# Altium footprint library FOC.PcbLib: 148 footprints (part 6 of 10)
Each footprint in its own frame and in the unit in brackets; x right, y up, seen from the top. Pads: shape width x height; smd on the part's side, far side on the other; paste and mask are expansions set on the pad; w line width, h text height; cw(c..) or ccw(c..) is an arc to the next point about the centre after c.
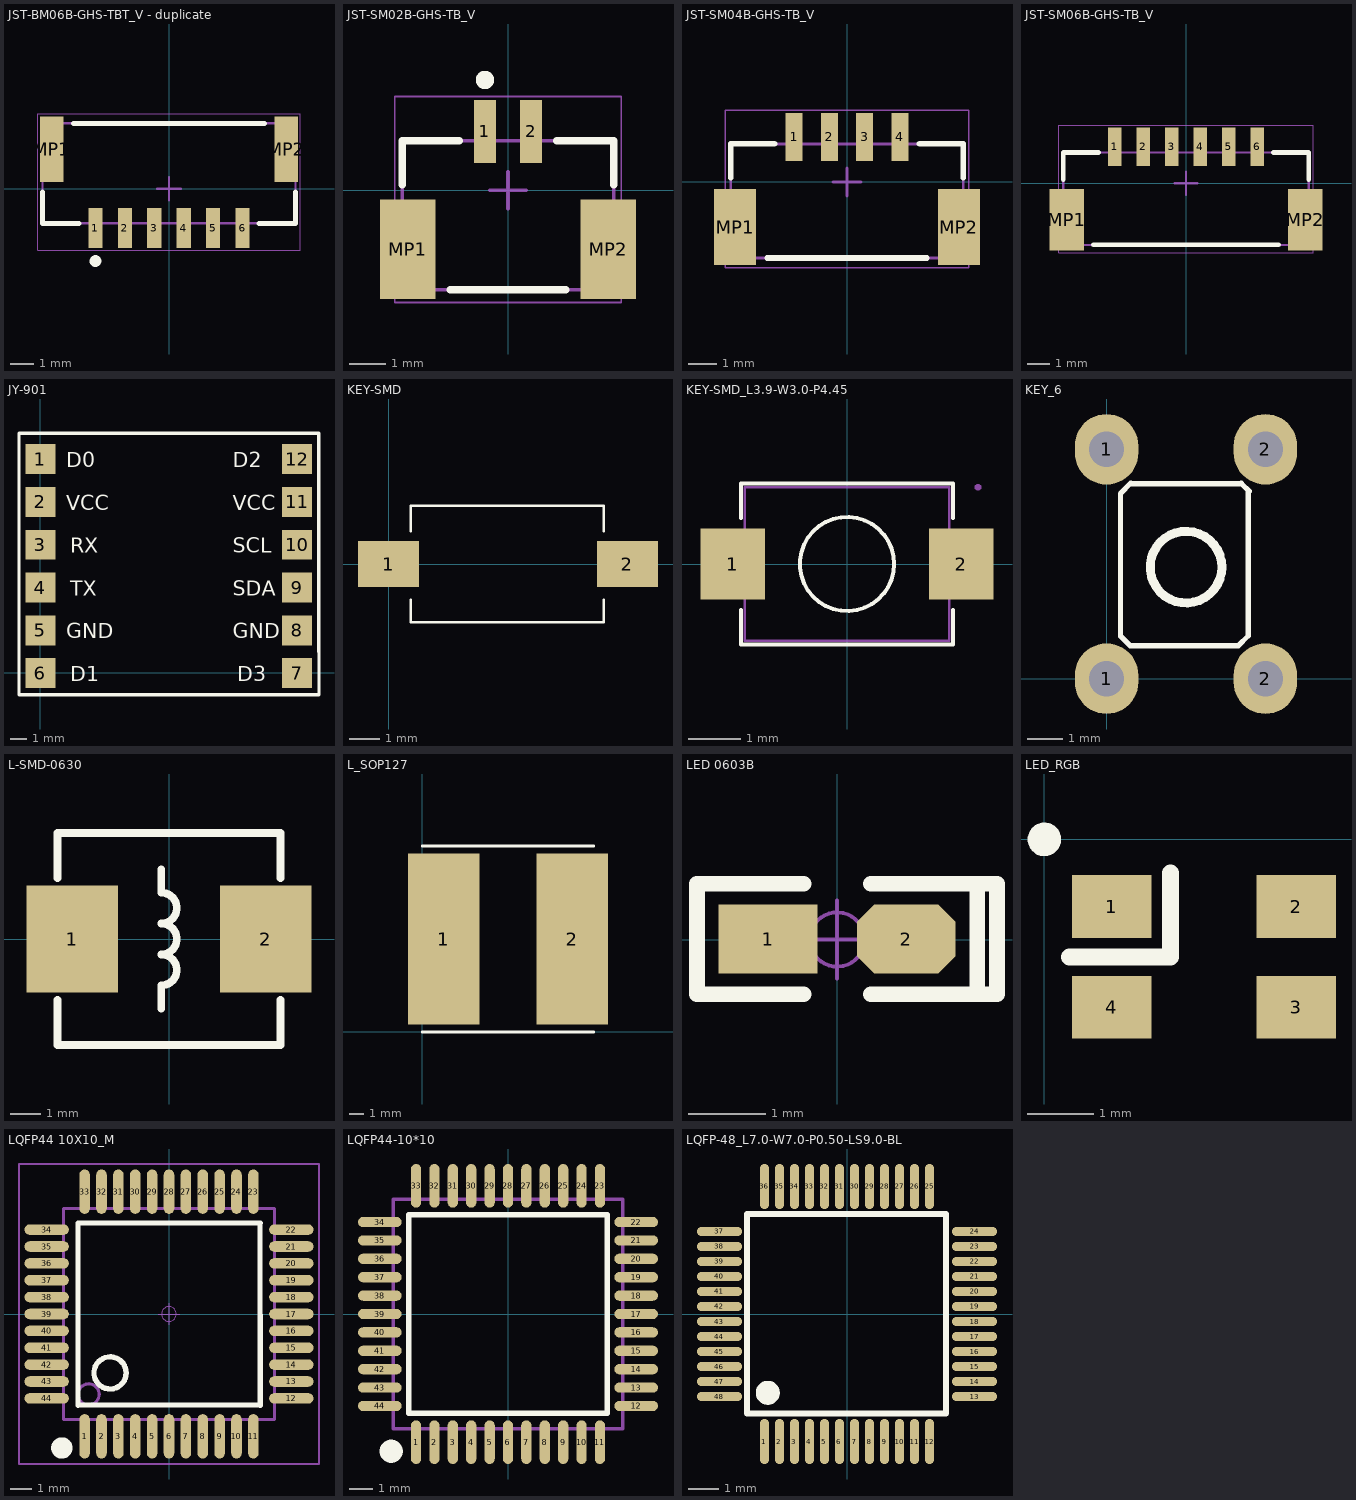
[diagram p5: the footprints below, top view; thin cyan lines are the x and y axes]

## JST-BM06B-GHS-TBT_V - duplicate [mm] "Connector, 6-Leads, Body 10.75x4.25mm, Pitch 1.25mm"
height 4.05
pads (8):
  rect 0.6x1.7 smd: 1(-3.125,-1.675) 2(-1.875,-1.675) 3(-0.625,-1.675) 4(0.625,-1.675) 5(1.875,-1.675) 6(3.125,-1.675)
  rect 1x2.8 smd: MP1(-4.975,1.675) MP2(4.975,1.675)
Top Overlay:
  circle w0.25: c-3.125,-3.075 r0.125
  lines w0.2: -5.375,-0.125 -5.375,-1.475 -3.825,-1.475 ; -4.075,2.775 4.075,2.775 ; 3.825,-1.475 5.375,-1.475 5.375,-0.125
Mechanical 13:
  lines w0.1: -5.375,-1.475 -5.375,2.775 5.375,2.775 5.375,-1.475 -5.375,-1.475
Mechanical 15:
  lines w0.05: -5.575,-2.625 -5.575,3.175 5.575,3.175 5.575,-2.625 -5.575,-2.625
  lines w0.1: -0.5,0 0.5,0 ; 0,-0.5 0,0.5
3D body "BM06B-GHS-TBT.STEP": height 4.2, standoff 0, extent -5.375,-2.175 5.375,2.775

## JST-SM02B-GHS-TB_V [mm] "SMD, 2-Leads, Body 5.75x4.05mm, Pitch 1.25mm"
height 4.35
pads (4):
  rect 0.6x1.7 smd: 1(-0.625,1.6) 2(0.625,1.6)
  rect 1.5x2.7 smd: MP1(-2.725,-1.6) MP2(2.725,-1.6)
Top Overlay:
  circle w0.25: c-0.625,3 r0.125
  lines w0.2: -2.875,0.15 -2.875,1.35 -1.325,1.35 ; -1.575,-2.7 1.575,-2.7 ; 1.325,1.35 2.875,1.35 2.875,0.15
Mechanical 13:
  lines w0.1: -2.875,-2.7 -2.875,1.35 2.875,1.35 2.875,-2.7 -2.875,-2.7
Mechanical 15:
  lines w0.05: -3.075,-3.05 -3.075,2.55 3.075,2.55 3.075,-3.05 -3.075,-3.05
  lines w0.1: -0.5,0 0.5,0 ; 0,-0.5 0,0.5
3D body "SM02B-GHS-TB.STEP": height 4.35, standoff 0, extent -2.875,-2.7 2.875,2.15

## JST-SM04B-GHS-TB_V [mm] "SMD, 4-Leads, Body 8.25x4.05mm, Pitch 1.25mm"
height 4.35
pads (6):
  rect 0.6x1.7 smd: 1(-1.875,1.6) 2(-0.625,1.6) 3(0.625,1.6) 4(1.875,1.6)
  rect 1.5x2.7 smd: MP1(-3.975,-1.6) MP2(3.975,-1.6)
Top Overlay:
  lines w0.2: -4.125,0.15 -4.125,1.35 -2.575,1.35 ; -2.825,-2.7 2.825,-2.7 ; 2.575,1.35 4.125,1.35 4.125,0.15
Mechanical 13:
  lines w0.1: -4.125,-2.7 -4.125,1.35 4.125,1.35 4.125,-2.7 -4.125,-2.7
Mechanical 15:
  lines w0.05: -4.325,-3.05 -4.325,2.55 4.325,2.55 4.325,-3.05 -4.325,-3.05
  lines w0.1: -0.5,0 0.5,0 ; 0,-0.5 0,0.5
3D body "SM04B-GHS-TB.STEP": height 4.35, standoff 0, extent -4.125,-2.7 4.125,2.15

## JST-SM06B-GHS-TB_V [mm] "SMD, 6-Leads, Body 10.75x4.05mm, Pitch 1.25mm"
height 4.35
pads (8):
  rect 0.6x1.7 smd: 1(-3.125,1.6) 2(-1.875,1.6) 3(-0.625,1.6) 4(0.625,1.6) 5(1.875,1.6) 6(3.125,1.6)
  rect 1.5x2.7 smd: MP1(-5.225,-1.6) MP2(5.225,-1.6)
Top Overlay:
  lines w0.2: -5.375,0.15 -5.375,1.35 -3.825,1.35 ; -4.075,-2.7 4.075,-2.7 ; 3.825,1.35 5.375,1.35 5.375,0.15
Mechanical 13:
  lines w0.1: -5.375,-2.7 -5.375,1.35 5.375,1.35 5.375,-2.7 -5.375,-2.7
Mechanical 15:
  lines w0.05: -5.575,-3.05 -5.575,2.55 5.575,2.55 5.575,-3.05 -5.575,-3.05
  lines w0.1: -0.5,0 0.5,0 ; 0,-0.5 0,0.5
3D body "SM06B-GHS-TB.STEP": height 4.35, standoff 0, extent -5.375,-2.7 5.375,2.15

## JY-901 [mil]
pads (12):
  rect 70x70 smd: 1(0.63,499.63) 2(0.63,399.63) 3(0.63,299.63) 4(0.63,199.63) 5(0.63,99.63) 6(0.63,-0.37) 7(600.63,-0.37) 8(600.63,99.63) 9(600.63,199.63) 10(600.63,299.63) 11(600.63,399.63) 12(600.63,499.63)
Top Overlay:
  lines w7.87: -49.37,49.63 -49.37,449.63 ; 650.63,449.63 650.63,49.63 651.63,49.63
  lines w8: -49.37,49.63 -49.37,-51.37 651.63,-51.37 651.63,49.63 ; -49.37,449.63 -49.37,560.63 650.63,560.63 650.63,449.63
  text "VCC" at 60.63,380.63 h35
  text "VCC" at 450.63,380.63 h35
  text "GND" at 60.63,80.63 h35
  text "GND" at 450.63,80.63 h35
  text "RX" at 70.63,280.63 h35
  text "TX" at 70.63,180.63 h35
  text "SDA" at 450.63,180.63 h35
  text "SCL" at 450.63,280.63 h35
  text "D0" at 60.63,480.63 h35
  text "D1" at 70.63,-19.37 h35
  text "D2" at 450.63,480.63 h35
  text "D3" at 460.63,-19.37 h35

## KEY-SMD [mm]
pads (2):
  rect 2x1.5 smd: 1(0,0) 2(7.8,0)
Top Overlay:
  lines w0.076: 0.725,-1.168 0.725,-1.9 7.025,-1.9 7.025,-1.168 ; 0.725,1.067 0.725,1.9 7.025,1.9 7.025,1.067
3D body "SMD按键.STEP": height 2.5, standoff 0, extent -0.059,-1.945 7.831,1.905

## KEY-SMD_L3.9-W3.0-P4.45 [mm]
pads (2):
  rect 1.23x1.36 smd: 1(-2.185,0) 2(2.185,0)
Top Overlay:
  circle w0.076: c0,0 r0.9
  lines w0.076: -2.026,-0.883 -2.026,-1.541 2.026,-1.541 2.026,-0.883 ; -2.026,0.883 -2.026,1.541 2.026,1.541 2.026,0.883
Mechanical 15:
  region: 2.56,1.465 2.56,1.49 2.525,1.525 2.475,1.525 2.44,1.49 2.44,1.465 2.44,1.44 2.475,1.405 2.525,1.405 2.56,1.44
  region: 2.5,0.65 2.5,-0.65 1.6,-0.65 1.6,0.65
  region: -2.5,0.65 -2.5,-0.65 -1.6,-0.65 -1.6,0.65
  lines w0.051: -1.95,-1.465 1.95,-1.465 1.95,1.465 -1.95,1.465 -1.95,-1.465
3D body "KEY-2PIN.STEP": height 1.95, standoff 0, extent -2.4,-1.45 2.4,1.45

## KEY_6 [mm]
pads (4):
  oval 1.8x2 hole 1: 1(0,0) 1(0,6.5) 2(4.5,0) 2(4.5,6.5)
Top Overlay:
  circle w0.254: c2.251,3.161 r1.016
  lines w0.152: 0.664,5.527 3.794,5.527 ; 0.684,5.537 0.394,5.247 0.394,5.207 0.394,1.207 0.664,0.937 3.734,0.937 4.014,1.217 4.014,4.877 4.014,5.327 ; 3.814,5.537 4.044,5.307
3D body "User Library-TPxxxx (Switch).step": height 4.9, standoff -3.59, extent -0.714,-0.508 5.286,7.47

## L-SMD-0630 [mm] "一体化成型电感"
pads (2):
  rect 3x3.5 smd: 1(-3.175,0) 2(3.175,0)
Top Overlay:
  lines w0.254: -3.658,-2.007 -3.658,-3.48 3.658,-3.48 3.658,-2.007 ; -3.658,2.007 -3.658,3.48 3.658,3.48 3.658,2.007 ; -0.254,-2.286 -0.254,-1.524 ccw(c-0.254,-1.016) -0.254,-0.508 ccw(c-0.254,0) -0.254,0.508 ccw(c-0.254,1.016) -0.254,1.524 -0.254,2.286
3D body "SMD-0630.STEP": height -0.46, standoff -3.48, extent -3.475,-3.3 3.475,3.3

## L_SOP127 [mm]
pads (2):
  rect 5x12 smd: 1(1.5,6.5) 2(10.5,6.5)
Top Overlay:
  lines w0.203: 0,0 12,0 ; 0,13 12,13
3D body "User Library-MSS1260.step": height 6.26, standoff 0.12, extent -0.156,0.352 12.144,12.653

## LED 0603B [mil] "蓝色0603LED"
pads (2):
  rect 50x35 smd: 1(-35,0.26)
  oct 50x35 smd: 2(35,0.26)
Top Overlay:
  lines w8: -17,-27.74 -71,-27.74 -71,-25.74 -71,28.26 -70,28.26 -17,28.26 ; 17,-27.74 70,-27.74 ; 17,28.26 71,28.26 81,28.26 81,-27.74 71,-27.74 71,26.26
Mechanical 15:
  circle w1.97: c0,0 r13.78
  lines w1.97: -19.68,0 19.68,0 ; 0,-19.68 0,19.68
3D body "LED 0603玻璃罩.STEP": height 23.82, standoff 8.07, extent -23.58,-15.79 23.58,15.79
3D body "LED 0603-B.STEP": height 18.36, standoff -0.16, extent -31.49,-15.79 31.5,15.79

## LED_RGB [mm] "RGB三色灯"
pads (4):
  rect 1.2x0.95 smd: 1(1.016,-1.016) 2(3.81,-1.016) 3(3.81,-2.54) 4(1.016,-2.54)
Top Overlay:
  circle w0.254: c0,0 r0.127
  lines w0.254: 0.381,-1.778 1.905,-1.778 1.905,-0.508

## LOGO_YR [mm] "YueRanLOGO"
Bottom Solder:
  text "YR" at -22.885,-7.112 h7.62

## LQFP44 10X10_M [mm] "44脚，体宽10x10mm，脚距0.8mm"
pads (44):
  oval 0.5x2.1 smd: 1(-4,-5.8) 2(-3.2,-5.8) 3(-2.4,-5.8) 4(-1.6,-5.8) 5(-0.8,-5.8) 6(0,-5.8) 7(0.8,-5.8) 8(1.6,-5.8) 9(2.4,-5.8) 10(3.2,-5.8) 11(4,-5.8) 23(4,5.8) 24(3.2,5.8) 25(2.4,5.8) 26(1.6,5.8) 27(0.8,5.8) 28(0,5.8) 29(-0.8,5.8) 30(-1.6,5.8) 31(-2.4,5.8) 32(-3.2,5.8) 33(-4,5.8)
  oval 2.1x0.5 smd: 12(5.8,-4) 13(5.8,-3.2) 14(5.8,-2.4) 15(5.8,-1.6) 16(5.8,-0.8) 17(5.8,0) 18(5.8,0.8) 19(5.8,1.6) 20(5.8,2.4) 21(5.8,3.2) 22(5.8,4) 34(-5.8,4) 35(-5.8,3.2) 36(-5.8,2.4) 37(-5.8,1.6) 38(-5.8,0.8) 39(-5.8,0) 40(-5.8,-0.8) 41(-5.8,-1.6) 42(-5.8,-2.4) 43(-5.8,-3.2) 44(-5.8,-4)
Top Overlay:
  circle w0.254: c-2.794,-2.794 r0.762
  circle w0.508: c-5.08,-6.35 r0.25
  lines w0.254: -4.318,-4.318 4.318,-4.318 4.318,4.318 -4.318,4.318 -4.318,-4.318
Mechanical 13:
  circle w0.15: c-3.81,-3.81 r0.5
  lines w0.15: -5,-5 5,-5 5,5 -5,5 -5,-5
Mechanical 15:
  circle w0.05: c0,0 r0.35
  lines w0.05: -0.5,0 0.5,0 ; 0,-0.5 0,0.5
  lines w0.1: -7.112,-7.112 7.112,-7.112 7.112,7.112 -7.112,7.112 -7.112,-7.112
3D body "LQFP44-10x10.STEP": height 1.45, standoff 0, extent -6.003,-6.003 6.003,6.003

## LQFP44-10*10 [mm] "10x10mm，0.8mm（蒜米工坊）"
pads (44):
  oval 0.45x1.9 smd: 1(-4,-5.575) 2(-3.2,-5.575) 3(-2.4,-5.575) 4(-1.6,-5.575) 5(-0.8,-5.575) 6(0,-5.575) 7(0.8,-5.575) 8(1.6,-5.575) 9(2.4,-5.575) 10(3.2,-5.575) 11(4,-5.575) 23(4,5.575) 24(3.2,5.575) 25(2.4,5.575) 26(1.6,5.575) 27(0.8,5.575) 28(0,5.575) 29(-0.8,5.575) 30(-1.6,5.575) 31(-2.4,5.575) 32(-3.2,5.575) 33(-4,5.575)
  oval 1.9x0.45 smd: 12(5.575,-4) 13(5.575,-3.2) 14(5.575,-2.4) 15(5.575,-1.6) 16(5.575,-0.8) 17(5.575,0) 18(5.575,0.8) 19(5.575,1.6) 20(5.575,2.4) 21(5.575,3.2) 22(5.575,4) 34(-5.575,4) 35(-5.575,3.2) 36(-5.575,2.4) 37(-5.575,1.6) 38(-5.575,0.8) 39(-5.575,0) 40(-5.575,-0.8) 41(-5.575,-1.6) 42(-5.575,-2.4) 43(-5.575,-3.2) 44(-5.575,-4)
Top Overlay:
  circle w0.508: c-5.08,-5.969 r0.25
  lines w0.254: -4.318,-4.318 4.318,-4.318 4.318,4.318 -4.318,4.318 -4.318,-4.318
Mechanical 13:
  lines w0.15: -5,-5 -5,5 5,5 5,-5 -5,-5
3D body "LQFP44-10x10.STEP": height 1.45, standoff 0, extent -5.969,-6.003 6.037,6.003

## LQFP-48_L7.0-W7.0-P0.50-LS9.0-BL [mm]
pads (48):
  oval 0.3x1.5 smd: 1(-2.75,-4.25) 2(-2.25,-4.25) 3(-1.75,-4.25) 4(-1.25,-4.25) 5(-0.75,-4.25) 6(-0.25,-4.25) 7(0.25,-4.25) 8(0.75,-4.25) 9(1.25,-4.25) 10(1.75,-4.25) 11(2.25,-4.25) 12(2.75,-4.25) 25(2.75,4.25) 26(2.25,4.25) 27(1.75,4.25) 28(1.25,4.25) 29(0.75,4.25) 30(0.25,4.25) 31(-0.25,4.25) 32(-0.75,4.25) 33(-1.25,4.25) 34(-1.75,4.25) 35(-2.25,4.25) 36(-2.75,4.25)
  oval 1.5x0.3 smd: 13(4.25,-2.75) 14(4.25,-2.25) 15(4.25,-1.75) 16(4.25,-1.25) 17(4.25,-0.75) 18(4.25,-0.25) 19(4.25,0.25) 20(4.25,0.75) 21(4.25,1.25) 22(4.25,1.75) 23(4.25,2.25) 24(4.25,2.75) 37(-4.25,2.75) 38(-4.25,2.25) 39(-4.25,1.75) 40(-4.25,1.25) 41(-4.25,0.75) 42(-4.25,0.25) 43(-4.25,-0.25) 44(-4.25,-0.75) 45(-4.25,-1.25) 46(-4.25,-1.75) 47(-4.25,-2.25) 48(-4.25,-2.75)
Top Overlay:
  lines w0.2: -2.896,3.34 3.302,3.34 3.302,-3.315 -3.327,-3.315 -3.327,3.34 -2.565,3.34
  lines w0.4: -2.642,-2.426 ccw(c-2.64,-2.626) -2.639,-2.426